# Altium footprint library PcbLib_Pin_Headers_part2.PcbLib: 68 footprints (part 2 of 5)
Each footprint in its own frame and in the unit in brackets; x right, y up, seen from the top. Pads: shape width x height; smd on the part's side, far side on the other; paste and mask are expansions set on the pad; w line width, h text height; cw(c..) or ccw(c..) is an arc to the next point about the centre after c.
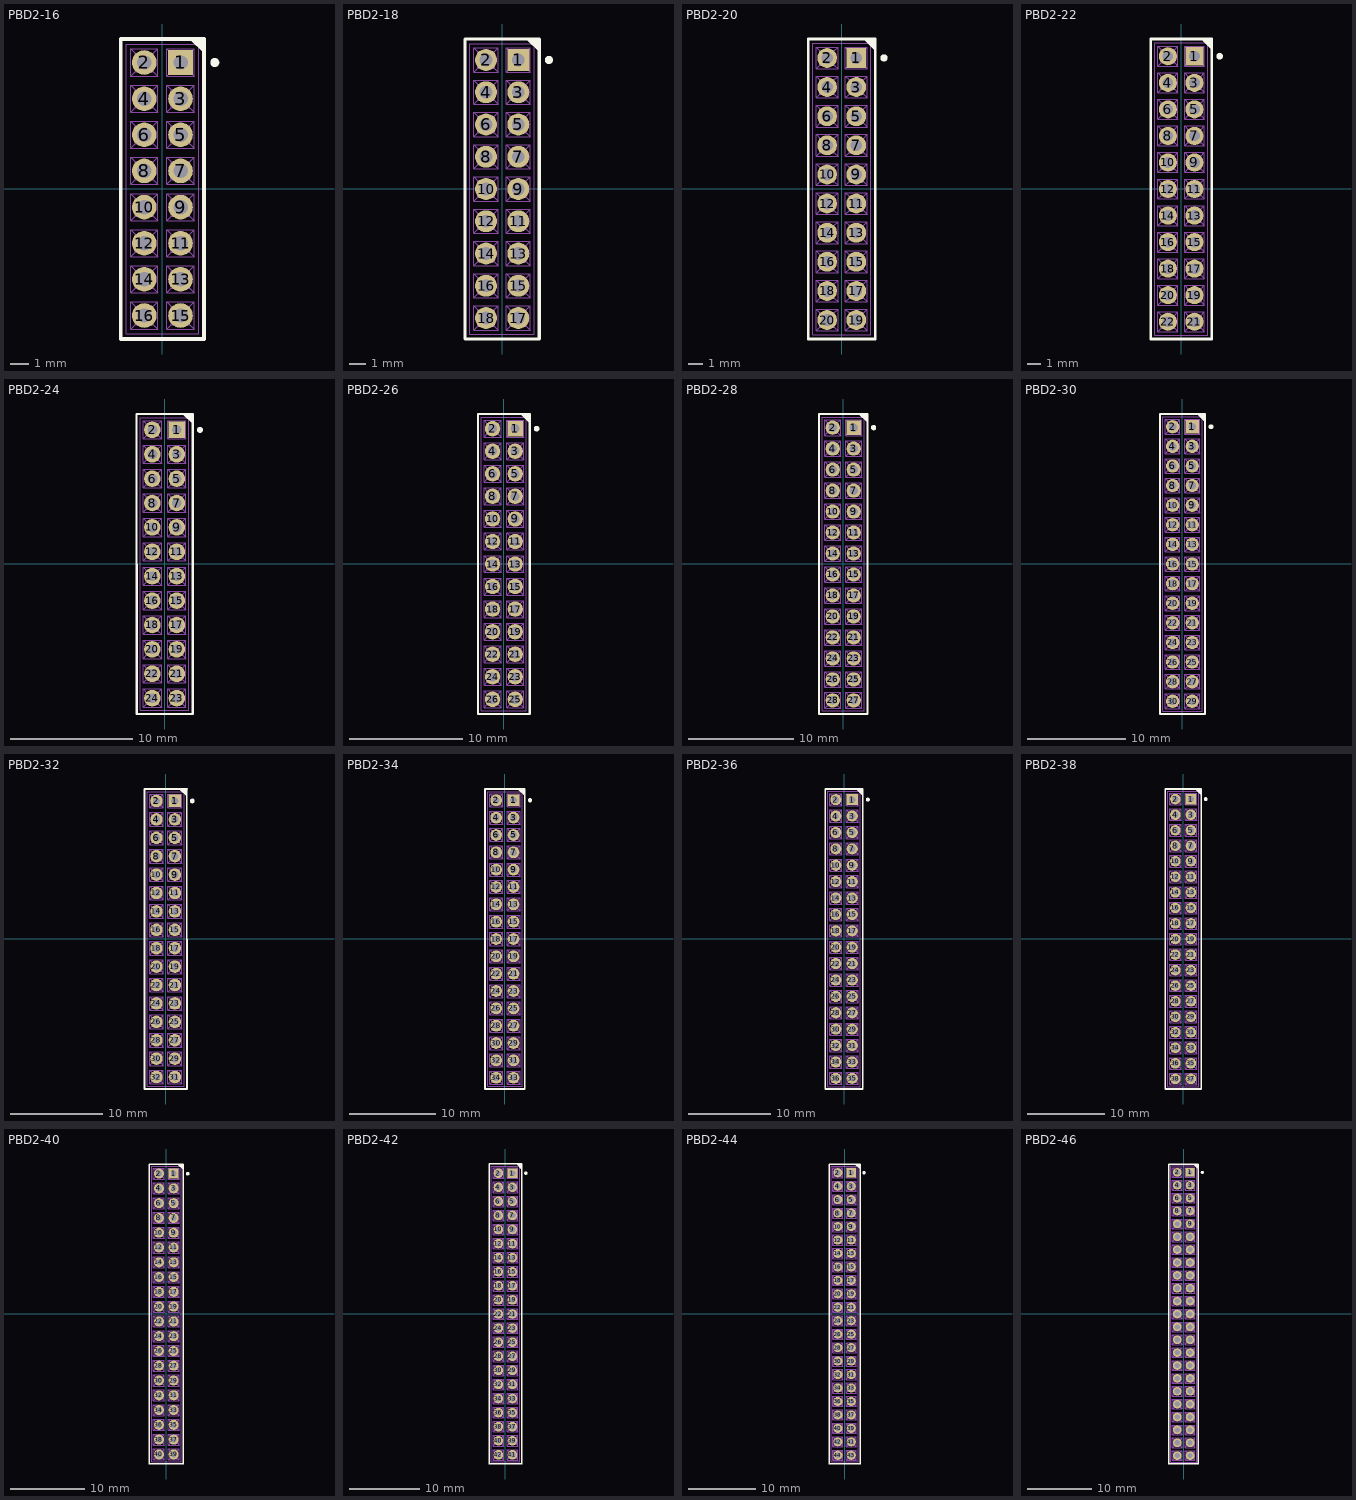
[diagram p1: the footprints below, top view; thin cyan lines are the x and y axes]

## PBD2-16 [mm]
pads (16):
  rect 1.36x1.36 hole 0.8: 1(1,7)
  round 1.36 hole 0.8: 2(-1,7) 3(1,5) 4(-1,5) 5(1,3) 6(-1,3) 7(1,1) 8(-1,1) 9(1,-1) 10(-1,-1) 11(1,-3) 12(-1,-3) 13(1,-5) 14(-1,-5) 15(1,-7) 16(-1,-7)
Top Overlay:
  circle w0.25: c2.9,7 r0.125
  region: 2.3,7.5 1.5,8.3 2.3,8.3
  lines w0.2: -2.3,-8.3 2.3,-8.3 2.3,8.3 -2.3,8.3 -2.3,-8.3
Top Assy:
  drawing of 452 lines, arcs and shapes, not listed
  text ".Designator" at 3.92,-3.098 h1.8
3D body "PBD2-16.STEP": height 4.37, standoff -2.63, extent -2,-8 2,8

## PBD2-18 [mm]
pads (18):
  rect 1.36x1.36 hole 0.8: 1(1,8)
  round 1.36 hole 0.8: 2(-1,8) 3(1,6) 4(-1,6) 5(1,4) 6(-1,4) 7(1,2) 8(-1,2) 9(1,0) 10(-1,0) 11(1,-2) 12(-1,-2) 13(1,-4) 14(-1,-4) 15(1,-6) 16(-1,-6) 17(1,-8) 18(-1,-8)
Top Overlay:
  circle w0.25: c2.9,8 r0.125
  region: 2.3,8.5 1.5,9.3 2.3,9.3
  lines w0.2: -2.3,-9.3 -2.3,9.3 2.3,9.3 2.3,-9.3 -2.3,-9.3
Top Assy:
  drawing of 508 lines, arcs and shapes, not listed
  text ".Designator" at 3.92,-3.098 h1.8
3D body "PBD2-18.STEP": height 4.37, standoff -2.63, extent -2,-9 2,9

## PBD2-20 [mm]
pads (20):
  rect 1.36x1.36 hole 0.8: 1(1,9)
  round 1.36 hole 0.8: 2(-1,9) 3(1,7) 4(-1,7) 5(1,5) 6(-1,5) 7(1,3) 8(-1,3) 9(1,1) 10(-1,1) 11(1,-1) 12(-1,-1) 13(1,-3) 14(-1,-3) 15(1,-5) 16(-1,-5) 17(1,-7) 18(-1,-7) 19(1,-9) 20(-1,-9)
Top Overlay:
  circle w0.25: c2.9,9 r0.125
  region: 2.3,9.5 1.5,10.3 2.3,10.3
  lines w0.2: -2.3,-10.3 -2.3,10.3 2.3,10.3 2.3,-10.3 -2.3,-10.3
Top Assy:
  drawing of 564 lines, arcs and shapes, not listed
  text ".Designator" at 3.92,-3.098 h1.8
3D body "PBD2-20.STEP": height 4.37, standoff -2.63, extent -2,-10 2,10

## PBD2-22 [mm]
pads (22):
  rect 1.36x1.36 hole 0.8: 1(1,10)
  round 1.36 hole 0.8: 2(-1,10) 3(1,8) 4(-1,8) 5(1,6) 6(-1,6) 7(1,4) 8(-1,4) 9(1,2) 10(-1,2) 11(1,0) 12(-1,0) 13(1,-2) 14(-1,-2) 15(1,-4) 16(-1,-4) 17(1,-6) 18(-1,-6) 19(1,-8) 20(-1,-8) 21(1,-10) 22(-1,-10)
Top Overlay:
  circle w0.25: c2.9,10 r0.125
  region: 2.3,10.5 1.5,11.3 2.3,11.3
  lines w0.2: -2.3,-11.3 -2.3,11.3 2.3,11.3 2.3,-11.3 -2.3,-11.3
Top Assy:
  drawing of 620 lines, arcs and shapes, not listed
  text ".Designator" at 3.92,-3.098 h1.8
3D body "PBD2-22.STEP": height 4.37, standoff -2.63, extent -2,-11 2,11

## PBD2-24 [mm]
pads (24):
  rect 1.36x1.36 hole 0.8: 1(1,11)
  round 1.36 hole 0.8: 2(-1,11) 3(1,9) 4(-1,9) 5(1,7) 6(-1,7) 7(1,5) 8(-1,5) 9(1,3) 10(-1,3) 11(1,1) 12(-1,1) 13(1,-1) 14(-1,-1) 15(1,-3) 16(-1,-3) 17(1,-5) 18(-1,-5) 19(1,-7) 20(-1,-7) 21(1,-9) 22(-1,-9) 23(1,-11) 24(-1,-11)
Top Overlay:
  circle w0.25: c2.9,11 r0.125
  region: 2.3,11.5 1.5,12.3 2.3,12.3
  lines w0.2: -2.3,-12.3 -2.3,12.3 2.3,12.3 2.3,-12.3 -2.3,-12.3
Top Assy:
  drawing of 676 lines, arcs and shapes, not listed
  text ".Designator" at 3.92,-3.098 h1.8
3D body "PBD2-24.STEP": height 4.37, standoff -2.63, extent -2,-12 2,12

## PBD2-26 [mm]
pads (26):
  rect 1.36x1.36 hole 0.8: 1(1,12)
  round 1.36 hole 0.8: 2(-1,12) 3(1,10) 4(-1,10) 5(1,8) 6(-1,8) 7(1,6) 8(-1,6) 9(1,4) 10(-1,4) 11(1,2) 12(-1,2) 13(1,0) 14(-1,0) 15(1,-2) 16(-1,-2) 17(1,-4) 18(-1,-4) 19(1,-6) 20(-1,-6) 21(1,-8) 22(-1,-8) 23(1,-10) 24(-1,-10) 25(1,-12) 26(-1,-12)
Top Overlay:
  circle w0.25: c2.9,12 r0.125
  region: 2.3,12.5 1.5,13.3 2.3,13.3
  lines w0.2: -2.3,-13.3 -2.3,13.3 2.3,13.3 2.3,-13.3 -2.3,-13.3
Top Assy:
  drawing of 732 lines, arcs and shapes, not listed
  text ".Designator" at 3.92,-3.098 h1.8
3D body "PBD2-26.STEP": height 4.37, standoff -2.63, extent -2,-13 2,13

## PBD2-28 [mm]
pads (28):
  rect 1.36x1.36 hole 0.8: 1(1,13)
  round 1.36 hole 0.8: 2(-1,13) 3(1,11) 4(-1,11) 5(1,9) 6(-1,9) 7(1,7) 8(-1,7) 9(1,5) 10(-1,5) 11(1,3) 12(-1,3) 13(1,1) 14(-1,1) 15(1,-1) 16(-1,-1) 17(1,-3) 18(-1,-3) 19(1,-5) 20(-1,-5) 21(1,-7) 22(-1,-7) 23(1,-9) 24(-1,-9) 25(1,-11) 26(-1,-11) 27(1,-13) 28(-1,-13)
Top Overlay:
  circle w0.25: c2.9,13 r0.125
  region: 2.3,13.5 1.5,14.3 2.3,14.3
  lines w0.2: -2.3,-14.3 2.3,-14.3 2.3,14.3 -2.3,14.3 -2.3,-14.3
Top Assy:
  drawing of 788 lines, arcs and shapes, not listed
  text ".Designator" at 3.92,-3.098 h1.8
3D body "PBD2-28.STEP": height 4.37, standoff -2.63, extent -2,-14 2,14

## PBD2-30 [mm]
pads (30):
  rect 1.36x1.36 hole 0.8: 1(1,14)
  round 1.36 hole 0.8: 2(-1,14) 3(1,12) 4(-1,12) 5(1,10) 6(-1,10) 7(1,8) 8(-1,8) 9(1,6) 10(-1,6) 11(1,4) 12(-1,4) 13(1,2) 14(-1,2) 15(1,0) 16(-1,0) 17(1,-2) 18(-1,-2) 19(1,-4) 20(-1,-4) 21(1,-6) 22(-1,-6) 23(1,-8) 24(-1,-8) 25(1,-10) 26(-1,-10) 27(1,-12) 28(-1,-12) 29(1,-14) 30(-1,-14)
Top Overlay:
  circle w0.25: c2.9,14 r0.125
  region: 2.3,14.5 1.5,15.3 2.3,15.3
  lines w0.2: -2.3,-15.3 -2.3,15.3 2.3,15.3 2.3,-15.3 -2.3,-15.3
Top Assy:
  drawing of 844 lines, arcs and shapes, not listed
  text ".Designator" at 3.92,-3.098 h1.8
3D body "PBD2-30.STEP": height 4.37, standoff -2.63, extent -2,-15 2,15

## PBD2-32 [mm]
pads (32):
  rect 1.36x1.36 hole 0.8: 1(1,15)
  round 1.36 hole 0.8: 2(-1,15) 3(1,13) 4(-1,13) 5(1,11) 6(-1,11) 7(1,9) 8(-1,9) 9(1,7) 10(-1,7) 11(1,5) 12(-1,5) 13(1,3) 14(-1,3) 15(1,1) 16(-1,1) 17(1,-1) 18(-1,-1) 19(1,-3) 20(-1,-3) 21(1,-5) 22(-1,-5) 23(1,-7) 24(-1,-7) 25(1,-9) 26(-1,-9) 27(1,-11) 28(-1,-11) 29(1,-13) 30(-1,-13) 31(1,-15) 32(-1,-15)
Top Overlay:
  circle w0.25: c2.9,15 r0.125
  region: 2.3,15.5 1.5,16.3 2.3,16.3
  lines w0.2: -2.3,-16.3 2.3,-16.3 2.3,16.3 -2.3,16.3 -2.3,-16.3
Top Assy:
  drawing of 900 lines, arcs and shapes, not listed
  text ".Designator" at 3.92,-3.098 h1.8
3D body "PBD2-32.STEP": height 4.37, standoff -2.63, extent -2,-16 2,16

## PBD2-34 [mm]
pads (34):
  rect 1.36x1.36 hole 0.8: 1(1,16)
  round 1.36 hole 0.8: 2(-1,16) 3(1,14) 4(-1,14) 5(1,12) 6(-1,12) 7(1,10) 8(-1,10) 9(1,8) 10(-1,8) 11(1,6) 12(-1,6) 13(1,4) 14(-1,4) 15(1,2) 16(-1,2) 17(1,0) 18(-1,0) 19(1,-2) 20(-1,-2) 21(1,-4) 22(-1,-4) 23(1,-6) 24(-1,-6) 25(1,-8) 26(-1,-8) 27(1,-10) 28(-1,-10) 29(1,-12) 30(-1,-12) 31(1,-14) 32(-1,-14) 33(1,-16) 34(-1,-16)
Top Overlay:
  circle w0.25: c2.9,16 r0.125
  region: 2.3,16.5 1.5,17.3 2.3,17.3
  lines w0.2: -2.3,-17.3 -2.3,17.3 2.3,17.3 2.3,-17.3 -2.3,-17.3
Top Assy:
  drawing of 956 lines, arcs and shapes, not listed
  text ".Designator" at 3.92,-3.098 h1.8
3D body "PBD2-34.STEP": height 4.37, standoff -2.63, extent -2,-17 2,17

## PBD2-36 [mm]
pads (36):
  rect 1.36x1.36 hole 0.8: 1(1,17)
  round 1.36 hole 0.8: 2(-1,17) 3(1,15) 4(-1,15) 5(1,13) 6(-1,13) 7(1,11) 8(-1,11) 9(1,9) 10(-1,9) 11(1,7) 12(-1,7) 13(1,5) 14(-1,5) 15(1,3) 16(-1,3) 17(1,1) 18(-1,1) 19(1,-1) 20(-1,-1) 21(1,-3) 22(-1,-3) 23(1,-5) 24(-1,-5) 25(1,-7) 26(-1,-7) 27(1,-9) 28(-1,-9) 29(1,-11) 30(-1,-11) 31(1,-13) 32(-1,-13) 33(1,-15) 34(-1,-15) 35(1,-17) 36(-1,-17)
Top Overlay:
  circle w0.25: c2.9,17 r0.125
  region: 2.3,17.5 1.5,18.3 2.3,18.3
  lines w0.2: -2.3,-18.3 2.3,-18.3 2.3,18.3 -2.3,18.3 -2.3,-18.3
Top Assy:
  drawing of 1012 lines, arcs and shapes, not listed
  text ".Designator" at 3.92,-3.098 h1.8
3D body "PBD2-36.STEP": height 4.37, standoff -2.63, extent -2,-18 2,18

## PBD2-38 [mm]
pads (38):
  rect 1.36x1.36 hole 0.8: 1(1,18)
  round 1.36 hole 0.8: 2(-1,18) 3(1,16) 4(-1,16) 5(1,14) 6(-1,14) 7(1,12) 8(-1,12) 9(1,10) 10(-1,10) 11(1,8) 12(-1,8) 13(1,6) 14(-1,6) 15(1,4) 16(-1,4) 17(1,2) 18(-1,2) 19(1,0) 20(-1,0) 21(1,-2) 22(-1,-2) 23(1,-4) 24(-1,-4) 25(1,-6) 26(-1,-6) 27(1,-8) 28(-1,-8) 29(1,-10) 30(-1,-10) 31(1,-12) 32(-1,-12) 33(1,-14) 34(-1,-14) 35(1,-16) 36(-1,-16) 37(1,-18) 38(-1,-18)
Top Overlay:
  circle w0.25: c2.9,18 r0.125
  region: 2.3,18.5 1.5,19.3 2.3,19.3
  lines w0.2: -2.3,-19.3 -2.3,19.3 2.3,19.3 2.3,-19.3 -2.3,-19.3
Top Assy:
  drawing of 1068 lines, arcs and shapes, not listed
  text ".Designator" at 3.92,-3.098 h1.8
3D body "PBD2-38.STEP": height 4.37, standoff -2.63, extent -2,-19 2,19

## PBD2-40 [mm]
pads (40):
  rect 1.36x1.36 hole 0.8: 1(1,19)
  round 1.36 hole 0.8: 2(-1,19) 3(1,17) 4(-1,17) 5(1,15) 6(-1,15) 7(1,13) 8(-1,13) 9(1,11) 10(-1,11) 11(1,9) 12(-1,9) 13(1,7) 14(-1,7) 15(1,5) 16(-1,5) 17(1,3) 18(-1,3) 19(1,1) 20(-1,1) 21(1,-1) 22(-1,-1) 23(1,-3) 24(-1,-3) 25(1,-5) 26(-1,-5) 27(1,-7) 28(-1,-7) 29(1,-9) 30(-1,-9) 31(1,-11) 32(-1,-11) 33(1,-13) 34(-1,-13) 35(1,-15) 36(-1,-15) 37(1,-17) 38(-1,-17) 39(1,-19) 40(-1,-19)
Top Overlay:
  circle w0.25: c2.9,19 r0.125
  region: 2.3,19.5 1.5,20.3 2.3,20.3
  lines w0.2: -2.3,-20.3 2.3,-20.3 2.3,20.3 -2.3,20.3 -2.3,-20.3
Top Assy:
  drawing of 1124 lines, arcs and shapes, not listed
  text ".Designator" at 3.92,-3.098 h1.8
3D body "PBD2-40.STEP": height 4.37, standoff -2.63, extent -2,-20 2,20

## PBD2-42 [mm]
pads (42):
  rect 1.36x1.36 hole 0.8: 1(1,20)
  round 1.36 hole 0.8: 2(-1,20) 3(1,18) 4(-1,18) 5(1,16) 6(-1,16) 7(1,14) 8(-1,14) 9(1,12) 10(-1,12) 11(1,10) 12(-1,10) 13(1,8) 14(-1,8) 15(1,6) 16(-1,6) 17(1,4) 18(-1,4) 19(1,2) 20(-1,2) 21(1,0) 22(-1,0) 23(1,-2) 24(-1,-2) 25(1,-4) 26(-1,-4) 27(1,-6) 28(-1,-6) 29(1,-8) 30(-1,-8) 31(1,-10) 32(-1,-10) 33(1,-12) 34(-1,-12) 35(1,-14) 36(-1,-14) 37(1,-16) 38(-1,-16) 39(1,-18) 40(-1,-18) 41(1,-20) 42(-1,-20)
Top Overlay:
  circle w0.25: c2.9,20 r0.125
  region: 2.3,20.5 1.5,21.3 2.3,21.3
  lines w0.2: -2.3,-21.3 -2.3,21.3 2.3,21.3 2.3,-21.3 -2.3,-21.3
Top Assy:
  drawing of 1180 lines, arcs and shapes, not listed
  text ".Designator" at 3.92,-3.098 h1.8
3D body "PBD2-42.STEP": height 4.37, standoff -2.63, extent -2,-21 2,21

## PBD2-44 [mm]
pads (44):
  rect 1.36x1.36 hole 0.8: 1(1,21)
  round 1.36 hole 0.8: 2(-1,21) 3(1,19) 4(-1,19) 5(1,17) 6(-1,17) 7(1,15) 8(-1,15) 9(1,13) 10(-1,13) 11(1,11) 12(-1,11) 13(1,9) 14(-1,9) 15(1,7) 16(-1,7) 17(1,5) 18(-1,5) 19(1,3) 20(-1,3) 21(1,1) 22(-1,1) 23(1,-1) 24(-1,-1) 25(1,-3) 26(-1,-3) 27(1,-5) 28(-1,-5) 29(1,-7) 30(-1,-7) 31(1,-9) 32(-1,-9) 33(1,-11) 34(-1,-11) 35(1,-13) 36(-1,-13) 37(1,-15) 38(-1,-15) 39(1,-17) 40(-1,-17) 41(1,-19) 42(-1,-19) 43(1,-21) 44(-1,-21)
Top Overlay:
  circle w0.25: c2.9,21 r0.125
  region: 2.3,21.5 1.5,22.3 2.3,22.3
  lines w0.2: -2.3,-22.3 2.3,-22.3 2.3,22.3 -2.3,22.3 -2.3,-22.3
Top Assy:
  drawing of 1236 lines, arcs and shapes, not listed
  text ".Designator" at 3.92,-3.098 h1.8
3D body "PBD2-44.STEP": height 4.37, standoff -2.63, extent -2,-22 2,22

## PBD2-46 [mm]
pads (46):
  rect 1.36x1.36 hole 0.8: 1(1,22)
  round 1.36 hole 0.8: 2(-1,22) 3(1,20) 4(-1,20) 5(1,18) 6(-1,18) 7(1,16) 8(-1,16) 9(1,14) 10(-1,14) 11(1,12) 12(-1,12) 13(1,10) 14(-1,10) 15(1,8) 16(-1,8) 17(1,6) 18(-1,6) 19(1,4) 20(-1,4) 21(1,2) 22(-1,2) 23(1,0) 24(-1,0) 25(1,-2) 26(-1,-2) 27(1,-4) 28(-1,-4) 29(1,-6) 30(-1,-6) 31(1,-8) 32(-1,-8) 33(1,-10) 34(-1,-10) 35(1,-12) 36(-1,-12) 37(1,-14) 38(-1,-14) 39(1,-16) 40(-1,-16) 41(1,-18) 42(-1,-18) 43(1,-20) 44(-1,-20) 45(1,-22) 46(-1,-22)
Top Overlay:
  circle w0.25: c2.9,22 r0.125
  region: 2.3,22.5 1.5,23.3 2.3,23.3
  lines w0.2: -2.3,-23.3 2.3,-23.3 2.3,23.3 -2.3,23.3 -2.3,-23.3
Top Assy:
  drawing of 1292 lines, arcs and shapes, not listed
  text ".Designator" at 3.92,-3.098 h1.8
3D body "PBD2-46.STEP": height 4.37, standoff -2.63, extent -2,-23 2,23